# Altium footprint library laihi.PcbLib: 222 footprints (part 13 of 14)
Each footprint in its own frame and in the unit in brackets; x right, y up, seen from the top. Pads: shape width x height; smd on the part's side, far side on the other; paste and mask are expansions set on the pad; w line width, h text height; cw(c..) or ccw(c..) is an arc to the next point about the centre after c.
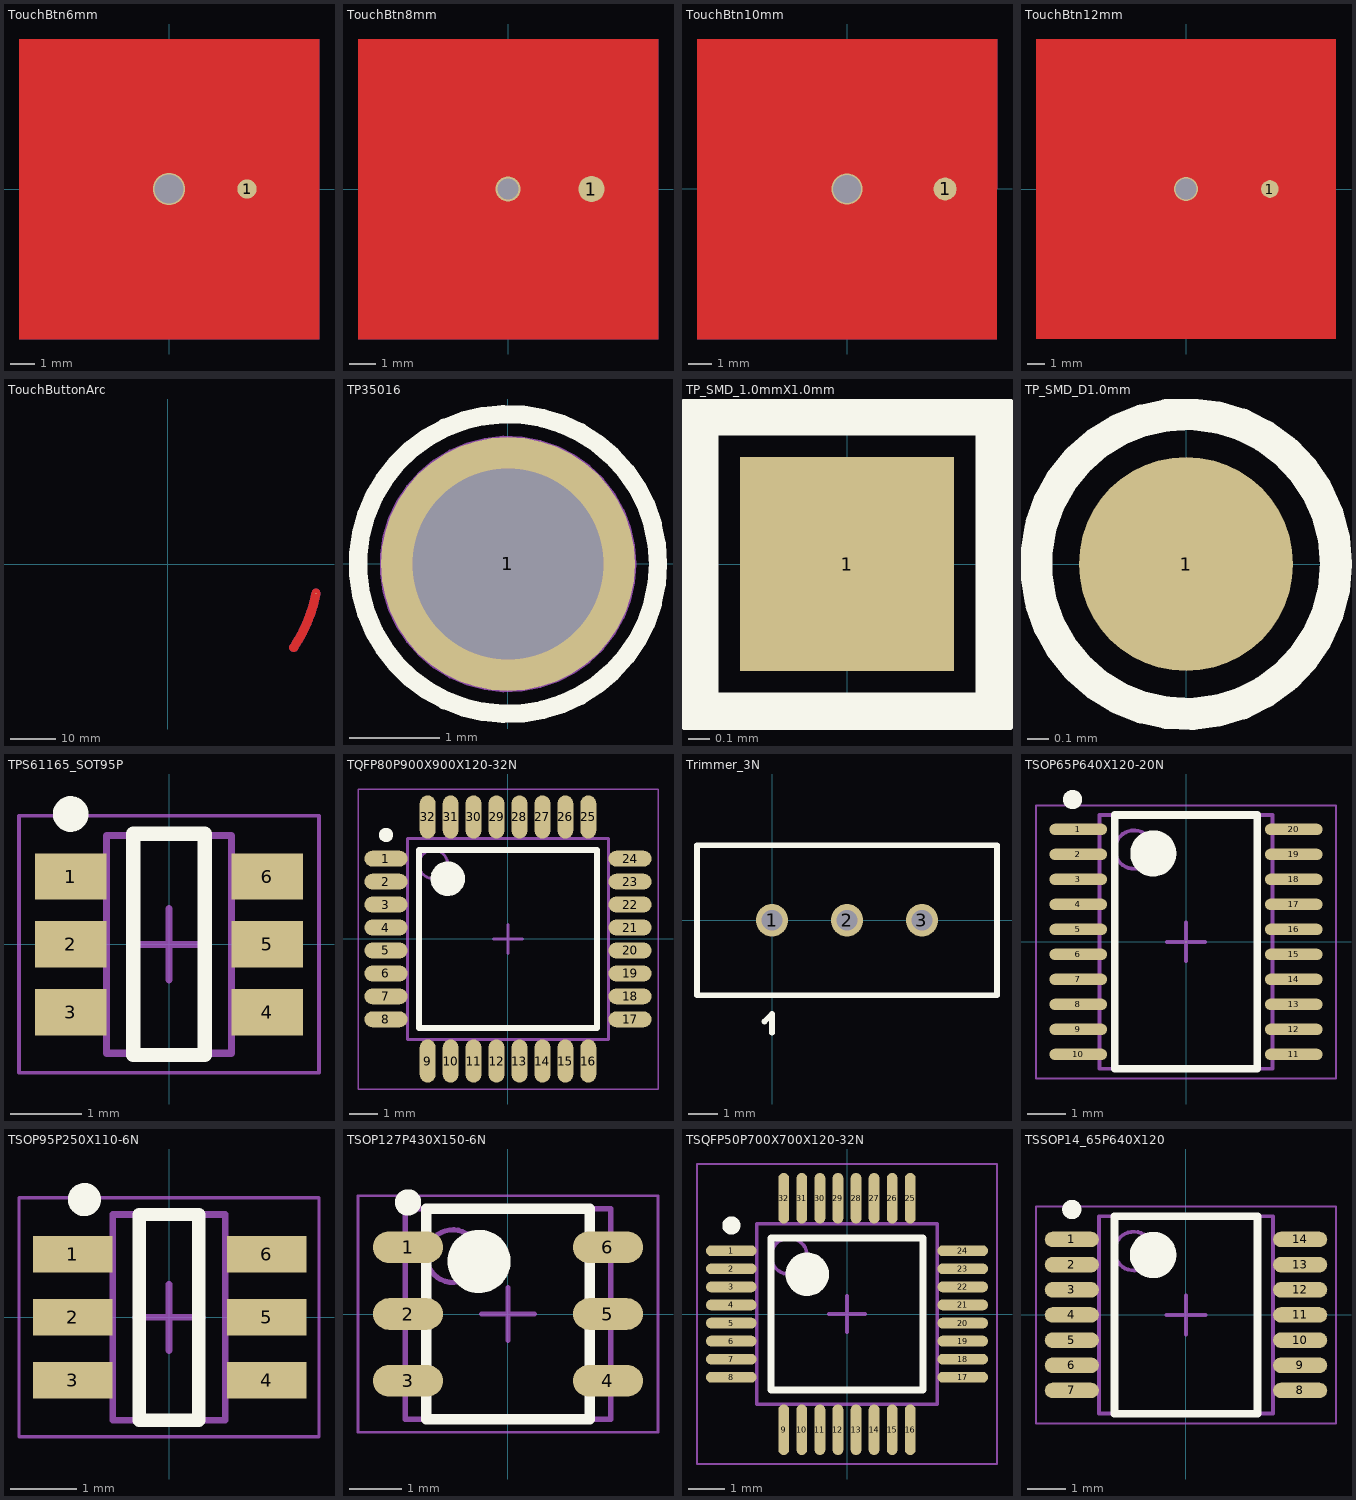
[diagram p12: the footprints below, top view; thin cyan lines are the x and y axes]

## TouchBtn6mm [mm] "Touch button 6mm diameter"
pads (2):
  round 0.8 smd: 1(3.25,0)
  round 1.35 hole 1.2: ""(0,0)
Top Layer:
  circle w1: c0,0 r3.25
  pour cut-out: -6.25,6.25 6.25,6.25 6.25,-6.25 -6.25,-6.25
Bottom Layer:
  pour cut-out: -6.25,6.25 6.25,6.25 6.25,-6.25 -6.25,-6.25
Top Solder:
  circle w1.15: c0,0 r3.25

## TouchBtn8mm [mm] "Touch button 8mm diameter"
pads (2):
  round 1 smd: 1(3.2,0)
  round 0.95 hole 0.8: ""(0,0)
Top Layer:
  circle w1.6: c0,0 r3.2
  pour cut-out: -5.75,5.75 5.75,5.75 5.75,-5.75 -5.75,-5.75
Bottom Layer:
  pour cut-out: -5.75,5.75 5.75,5.75 5.75,-5.75 -5.75,-5.75
Top Solder:
  circle w1.75: c0,0 r3.2

## TouchBtn10mm [mm] "Touch button 10mm diameter"
pads (2):
  round 1 smd: 1(4.25,0)
  round 1.35 hole 1.2: ""(0,0)
Top Layer:
  circle w2: c0,0 r4.25
  pour cut-out: -6.5,6.5 6.5,6.5 6.5,-6.5 -6.5,-6.5
Bottom Layer:
  pour cut-out: -6.5,6.5 6.5,6.5 6.5,-6.5 -6.5,-6.5
Top Solder:
  circle w2.15: c0,0 r4.25

## TouchBtn12mm [mm] "Touch button 12mm diameter"
pads (2):
  round 1 smd: 1(4.75,0)
  round 1.35 hole 1.2: ""(0,0)
Top Layer:
  circle w2.5: c0,0 r4.75
  pour cut-out: -8.5,8.5 8.5,8.5 8.5,-8.5 -8.5,-8.5
Bottom Layer:
  pour cut-out: -8.5,8.5 8.5,8.5 8.5,-8.5 -8.5,-8.5
Top Solder:
  circle w2.65: c0,0 r4.75

## TouchButtonArc [mm] "Touch button on the edge"
pads (1):
  round 0.2 smd paste-10: 1(32.423,-6.404)
Top Layer:
  lines w2: 27.527,-18.219 ccw(c0.27,0) 32.423,-6.404
Bottom Layer:
  lines w2: 27.527,-18.219 ccw(c0.27,0) 32.423,-6.404
Top Solder:
  lines w2.15: 27.527,-18.219 ccw(c0.27,0) 32.423,-6.404
Bottom Solder:
  lines w2.15: 27.527,-18.219 ccw(c0.27,0) 32.423,-6.404

## TP35016 [mil]
pads (1):
  round 110 hole 82.68: 1(0,0)
Top Overlay:
  circle w8: c0,0 r65
Mechanical 13:
  circle w1: c0,0 r39.37
  circle w1: c0,0 r55.12

## TP_SMD_1.0mmX1.0mm [mm]
pads (1):
  rect 1x1 smd: 1(0,0)
Top Overlay:
  lines w0.2: -0.7,-0.7 0.7,-0.7 0.7,0.7 -0.7,0.7 -0.7,-0.7

## TP_SMD_D1.0mm [mm]
pads (1):
  round 1 smd paste-5: 1(0,0)
Top Overlay:
  circle w0.15: c0,0 r0.7

## TPS61165_SOT95P [mm] "SOT23, 6-Leads, Body 2.90x2.80mm, Pitch 0.95mm, IPC Medium Density"
height 1.45
pads (6):
  rect 1x0.65 smd: 1(-1.375,0.95) 2(-1.375,0) 3(-1.375,-0.95) 4(1.375,-0.95) 5(1.375,0) 6(1.375,0.95)
Top Overlay:
  circle w0.25: c-1.375,1.825 r0.125
  lines w0.2: -0.5,-1.55 -0.5,1.55 0.5,1.55 0.5,-1.55 -0.5,-1.55
Mechanical 13:
  lines w0.1: -0.875,-1.525 0.875,-1.525 0.875,1.525 -0.875,1.525 -0.875,-1.525
Mechanical 15:
  lines w0.05: -2.1,-1.8 2.1,-1.8 2.1,1.8 -2.1,1.8 -2.1,-1.8
  lines w0.1: -0.5,0 0.5,0 ; 0,-0.5 0,0.5
3D body: height 1.45, standoff 0.1, extent -0.875,-1.525 0.875,1.525

## TQFP80P900X900X120-32N [mm] "TQFP, 32-Leads, Body 7.00x7.00mm, Pitch 0.80mm, IPC Medium Density"
height 1.2
pads (32):
  oval 1.5x0.55 smd: 1(-4.25,2.8) 2(-4.25,2) 3(-4.25,1.2) 4(-4.25,0.4) 5(-4.25,-0.4) 6(-4.25,-1.2) 7(-4.25,-2) 8(-4.25,-2.8) 17(4.25,-2.8) 18(4.25,-2) 19(4.25,-1.2) 20(4.25,-0.4) 21(4.25,0.4) 22(4.25,1.2) 23(4.25,2) 24(4.25,2.8)
  oval 0.55x1.5 smd: 9(-2.8,-4.25) 10(-2,-4.25) 11(-1.2,-4.25) 12(-0.4,-4.25) 13(0.4,-4.25) 14(1.2,-4.25) 15(2,-4.25) 16(2.8,-4.25) 25(2.8,4.25) 26(2,4.25) 27(1.2,4.25) 28(0.4,4.25) 29(-0.4,4.25) 30(-1.2,4.25) 31(-2,4.25) 32(-2.8,4.25)
Top Overlay:
  circle w0.25: c-4.25,3.625 r0.125
  circle w0.6: c-2.1,2.1 r0.3
  lines w0.2: -3.1,-3.1 -3.1,3.1 3.1,3.1 3.1,-3.1 -3.1,-3.1
Mechanical 13:
  circle w0.1: c-2.6,2.6 r0.5
  lines w0.1: -3.5,-3.5 -3.5,3.5 3.5,3.5 3.5,-3.5 -3.5,-3.5
Mechanical 15:
  lines w0.05: -5.225,-5.225 -5.225,5.225 5.225,5.225 5.225,-5.225 -5.225,-5.225
  lines w0.1: -0.5,0 0.5,0 ; 0,-0.5 0,0.5
3D body "TQFP80P900X900X120-32N.step": height 1.2, standoff 0, extent -4.5,-4.5 4.5,4.5

## Trimmer_3N [mm] "Trimmer 3296"
height 10
pads (3):
  round 1.1 hole 0.7: 1(0,0) 2(2.54,0) 3(5.08,0)
Top Overlay:
  lines w0.2: -0.254,-3.429 0,-3.175 0,-3.81 ; -2.54,-2.54 7.62,-2.54 7.62,2.54 -2.54,2.54 -2.54,-2.54

## TSOP65P640X120-20N [mm] "TSOP, 20-Leads, Body 6.50x4.40mm, Pitch 0.65mm, IPC Medium Density"
height 1.2
pads (20):
  oval 1.5x0.3 smd: 1(-2.8,2.925) 2(-2.8,2.275) 3(-2.8,1.625) 4(-2.8,0.975) 5(-2.8,0.325) 6(-2.8,-0.325) 7(-2.8,-0.975) 8(-2.8,-1.625) 9(-2.8,-2.275) 10(-2.8,-2.925) 11(2.8,-2.925) 12(2.8,-2.275) 13(2.8,-1.625) 14(2.8,-0.975) 15(2.8,-0.325) 16(2.8,0.325) 17(2.8,0.975) 18(2.8,1.625) 19(2.8,2.275) 20(2.8,2.925)
Top Overlay:
  circle w0.6: c-0.85,2.3 r0.3
  circle w0.25: c-2.95,3.7 r0.125
  lines w0.2: -1.85,-3.3 1.85,-3.3 1.85,3.3 -1.85,3.3 -1.85,-3.3
Mechanical 13:
  circle w0.1: c-1.35,2.4 r0.5
  lines w0.1: -2.25,-3.3 2.25,-3.3 2.25,3.3 -2.25,3.3 -2.25,-3.3
Mechanical 15:
  lines w0.05: -3.9,-3.55 3.9,-3.55 3.9,3.55 -3.9,3.55 -3.9,-3.55
  lines w0.1: -0.5,0 0.5,0 ; 0,-0.5 0,0.5
3D body "TSOP65P640X120-20N.step": height 1.2, standoff 0, extent -3.2,-3.3 3.2,3.3

## TSOP95P250X110-6N [mm] "TSOP, 6-Leads, Body 2.90x1.60mm, Pitch 0.95mm, IPC Medium Density"
height 1.1
pads (6):
  rect 1.2x0.55 smd: 1(-1.448,0.95) 2(-1.448,0) 3(-1.448,-0.95) 4(1.473,-0.95) 5(1.473,0) 6(1.473,0.95)
Top Overlay:
  circle w0.25: c-1.275,1.775 r0.125
  lines w0.2: -0.45,-1.55 0.45,-1.55 0.45,1.55 -0.45,1.55 -0.45,-1.55
Mechanical 13:
  lines w0.1: -0.85,-1.55 0.85,-1.55 0.85,1.55 -0.85,1.55 -0.85,-1.55
Mechanical 15:
  lines w0.05: -2.261,-1.8 2.261,-1.8 2.261,1.8 -2.261,1.8 -2.261,-1.8
  lines w0.1: -0.5,0 0.5,0 ; 0,-0.5 0,0.5
3D body: height 1.1, standoff 0.1, extent -0.85,-1.55 0.85,1.55

## TSOP127P430X150-6N [mm] "TSOP, 6-Leads, Body 3.93x3.76mm, Pitch 1.27mm, IPC Medium Density"
height 1.5
pads (6):
  oval 1.33x0.6 smd: 1(-1.9,1.27) 2(-1.9,0) 3(-1.9,-1.27) 4(1.9,-1.27) 5(1.9,0) 6(1.9,1.27)
Top Overlay:
  circle w0.6: c-0.55,1 r0.3
  circle w0.25: c-1.9,2.12 r0.125
  lines w0.2: -1.55,-2 1.55,-2 1.55,2 -1.55,2 -1.55,-2
Mechanical 13:
  circle w0.1: c-1.05,1.1 r0.5
  lines w0.1: -1.95,-2 1.95,-2 1.95,2 -1.95,2 -1.95,-2
Mechanical 15:
  lines w0.05: -2.85,-2.25 2.85,-2.25 2.85,2.25 -2.85,2.25 -2.85,-2.25
  lines w0.1: -0.5,0 0.5,0 ; 0,-0.5 0,0.5
3D body: height 1.5, standoff 0.15, extent -1.95,-2 1.95,2

## TSQFP50P700X700X120-32N [mm] "TSQFP, 32-Leads, Body 5.00x5.00mm, Pitch 0.50mm, IPC Medium Density"
height 1.2
pads (32):
  oval 1.4x0.3 smd mask+0.05: 1(-3.2,1.75) 2(-3.2,1.25) 3(-3.2,0.75) 4(-3.2,0.25) 5(-3.2,-0.25) 6(-3.2,-0.75) 7(-3.2,-1.25) 8(-3.2,-1.75) 17(3.2,-1.75) 18(3.2,-1.25) 19(3.2,-0.75) 20(3.2,-0.25) 21(3.2,0.25) 22(3.2,0.75) 23(3.2,1.25) 24(3.2,1.75)
  oval 0.3x1.4 smd mask+0.05: 9(-1.75,-3.2) 10(-1.25,-3.2) 11(-0.75,-3.2) 12(-0.25,-3.2) 13(0.25,-3.2) 14(0.75,-3.2) 15(1.25,-3.2) 16(1.75,-3.2) 25(1.75,3.2) 26(1.25,3.2) 27(0.75,3.2) 28(0.25,3.2) 29(-0.25,3.2) 30(-0.75,3.2) 31(-1.25,3.2) 32(-1.75,3.2)
Top Overlay:
  circle w0.25: c-3.2,2.45 r0.125
  circle w0.6: c-1.1,1.1 r0.3
  lines w0.2: -2.1,-2.1 -2.1,2.1 2.1,2.1 2.1,-2.1 -2.1,-2.1
Mechanical 13:
  circle w0.1: c-1.6,1.6 r0.5
  lines w0.1: -2.5,-2.5 -2.5,2.5 2.5,2.5 2.5,-2.5 -2.5,-2.5
Mechanical 15:
  lines w0.05: -4.15,-4.15 -4.15,4.15 4.15,4.15 4.15,-4.15 -4.15,-4.15
  lines w0.1: -0.5,0 0.5,0 ; 0,-0.5 0,0.5
3D body "TSQFP50P700X700X120-32N.step": height 1.2, standoff 0, extent -3.5,-3.5 3.5,3.5

## TSSOP14_65P640X120 [mm] "TSSOP, 14-Leads, Body 5.00x4.40mm, Pitch 0.65mm, IPC Medium Density"
height 1.2
pads (14):
  oval 1.4x0.4 smd mask+0.05: 1(-2.95,1.95) 2(-2.95,1.3) 3(-2.95,0.65) 4(-2.95,0) 5(-2.95,-0.65) 6(-2.95,-1.3) 7(-2.95,-1.95) 8(2.95,-1.95) 9(2.95,-1.3) 10(2.95,-0.65) 11(2.95,0) 12(2.95,0.65) 13(2.95,1.3) 14(2.95,1.95)
Top Overlay:
  circle w0.6: c-0.85,1.55 r0.3
  circle w0.25: c-2.95,2.725 r0.125
  lines w0.2: -1.85,-2.55 1.85,-2.55 1.85,2.55 -1.85,2.55 -1.85,-2.55
Mechanical 13:
  circle w0.1: c-1.35,1.65 r0.5
  lines w0.1: -2.25,-2.55 2.25,-2.55 2.25,2.55 -2.25,2.55 -2.25,-2.55
Mechanical 15:
  lines w0.05: -3.875,-2.8 3.875,-2.8 3.875,2.8 -3.875,2.8 -3.875,-2.8
  lines w0.1: -0.5,0 0.5,0 ; 0,-0.5 0,0.5
3D body "TSSOP14_65P640X120.step": height 1.2, standoff 0, extent -3.2,-2.55 3.2,2.55